# Altium integrated library Integrated_Library - 02.02.25 - 22.49.IntLib: 792 symbols (part 6 of 11)
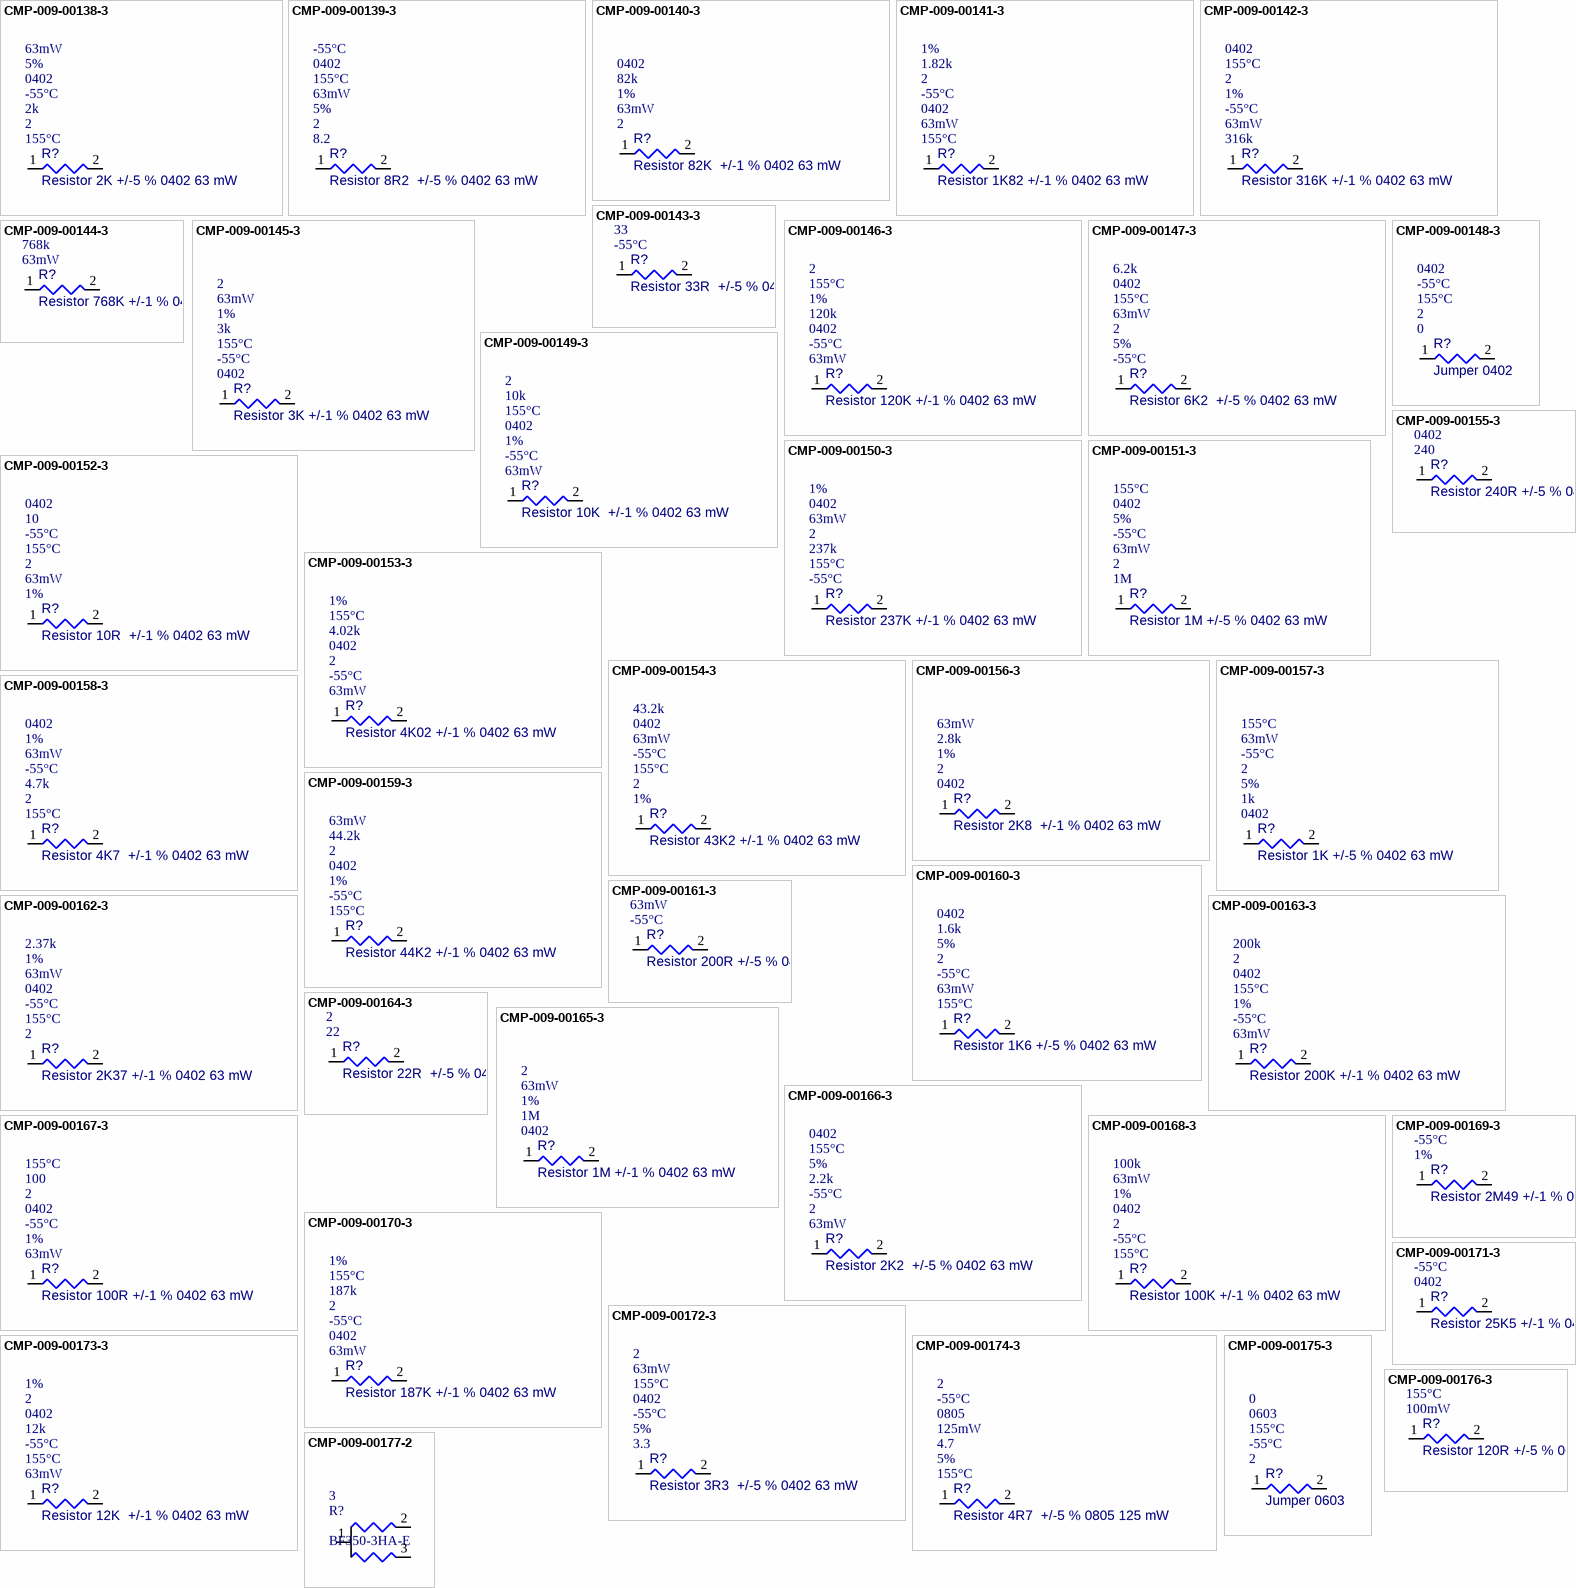
[diagram p31: symbols CMP-009-00138-3 to CMP-009-00177-2]

## CMP-009-00150-3
designator R?, comment Resistor 237K +/-1 % 0402 63 mW  value 237k  Min Operating Temperature: -55°C  Max Operating Temperature: 155°C  Pins: 2  Power: 63mW  Case/Package: 0402  Tolerance: 1%
Chip Resistor, 237 kOhms, +/-1 %, 63 mW, -55 to 155 degC, 0402
footprint RESC0805(2012)_L (Chip Resistor, Body 2.0x1.3mm, IPC High Density)
footprint RESC0402(1005)_L-1 (Chip Resistor, Body 1.0x0.5mm, IPC High Density)
pins: 1, 2
1 alternate drawing of the same symbol

## CMP-009-00151-3
designator R?, comment Resistor 1M +/-5 % 0402 63 mW  value 1M  Pins: 2  Power: 63mW  Min Operating Temperature: -55°C  Tolerance: 5%  Case/Package: 0402  Max Operating Temperature: 155°C
Chip Resistor, 1 MOhms, +/-5 %, 63 mW, -55 to 155 degC, 0402
footprint RESC0805(2012)_L (Chip Resistor, Body 2.0x1.3mm, IPC High Density)
footprint RESC0402(1005)_L-1 (Chip Resistor, Body 1.0x0.5mm, IPC High Density)
pins: 1, 2
1 alternate drawing of the same symbol

## CMP-009-00152-3
designator R?, comment Resistor 10R  +/-1 % 0402 63 mW  value 10  Tolerance: 1%  Power: 63mW  Pins: 2  Max Operating Temperature: 155°C  Min Operating Temperature: -55°C  Case/Package: 0402
Chip Resistor, 10 Ohms, +/-1 %, 63 mW, -55 to 155 degC, 0402
footprint RESC0805(2012)_L (Chip Resistor, Body 2.0x1.3mm, IPC High Density)
footprint RESC0402(1005)_L-1 (Chip Resistor, Body 1.0x0.5mm, IPC High Density)
pins: 1, 2
1 alternate drawing of the same symbol

## CMP-009-00153-3
designator R?, comment Resistor 4K02 +/-1 % 0402 63 mW  value 4.02k  Power: 63mW  Min Operating Temperature: -55°C  Pins: 2  Case/Package: 0402  Max Operating Temperature: 155°C  Tolerance: 1%
Chip Resistor, 4,02 kOhms, +/-1 %, 63 mW, -55 to 155 degC, 0402
footprint RESC0805(2012)_L (Chip Resistor, Body 2.0x1.3mm, IPC High Density)
footprint RESC0402(1005)_L-1 (Chip Resistor, Body 1.0x0.5mm, IPC High Density)
pins: 1, 2
1 alternate drawing of the same symbol

## CMP-009-00154-3
designator R?, comment Resistor 43K2 +/-1 % 0402 63 mW  value 43.2k  Tolerance: 1%  Pins: 2  Max Operating Temperature: 155°C  Min Operating Temperature: -55°C  Power: 63mW  Case/Package: 0402
Chip Resistor, 43,2 kOhms, +/-1 %, 63 mW, -55 to 155 degC, 0402
footprint RESC0805(2012)_L (Chip Resistor, Body 2.0x1.3mm, IPC High Density)
footprint RESC0402(1005)_L-1 (Chip Resistor, Body 1.0x0.5mm, IPC High Density)
pins: 1, 2
1 alternate drawing of the same symbol

## CMP-009-00155-3
designator R?, comment Resistor 240R +/-5 % 0402 63 mW  value 240  Case/Package: 0402  Pins: 2  Max Operating Temperature: 155°C  Min Operating Temperature: -55°C  Power: 63mW  Tolerance: 5%
Chip Resistor, 240 Ohms, +/-5 %, 63 mW, -55 to 155 degC, 0402
footprint RESC0805(2012)_L (Chip Resistor, Body 2.0x1.3mm, IPC High Density)
footprint RESC0402(1005)_L-1 (Chip Resistor, Body 1.0x0.5mm, IPC High Density)
pins: 1, 2
1 alternate drawing of the same symbol

## CMP-009-00156-3
designator R?, comment Resistor 2K8  +/-1 % 0402 63 mW  value 2.8k  Case/Package: 0402  Pins: 2  Tolerance: 1%  Power: 63mW
Chip Resistor, 2,8 kOhms, +/-1 %, 63 mW, -55 to 155 degC, 0402
footprint RESC0805(2012)_L (Chip Resistor, Body 2.0x1.3mm, IPC High Density)
footprint RESC0402(1005)_L-1 (Chip Resistor, Body 1.0x0.5mm, IPC High Density)
pins: 1, 2
1 alternate drawing of the same symbol

## CMP-009-00157-3
designator R?, comment Resistor 1K +/-5 % 0402 63 mW  value 1k  Case/Package: 0402  Tolerance: 5%  Pins: 2  Min Operating Temperature: -55°C  Power: 63mW  Max Operating Temperature: 155°C
Chip Resistor, 1 kOhms, +/-5 %, 63 mW, -55 to 155 degC, 0402
footprint RESC0805(2012)_L (Chip Resistor, Body 2.0x1.3mm, IPC High Density)
footprint RESC0402(1005)_L-1 (Chip Resistor, Body 1.0x0.5mm, IPC High Density)
pins: 1, 2
1 alternate drawing of the same symbol

## CMP-009-00158-3
designator R?, comment Resistor 4K7  +/-1 % 0402 63 mW  value 4.7k  Max Operating Temperature: 155°C  Pins: 2  Min Operating Temperature: -55°C  Power: 63mW  Tolerance: 1%  Case/Package: 0402
Chip Resistor, 4,7 kOhms, +/-1 %, 63 mW, -55 to 155 degC, 0402
footprint RESC0805(2012)_L (Chip Resistor, Body 2.0x1.3mm, IPC High Density)
footprint RESC0402(1005)_L-1 (Chip Resistor, Body 1.0x0.5mm, IPC High Density)
pins: 1, 2
1 alternate drawing of the same symbol

## CMP-009-00159-3
designator R?, comment Resistor 44K2 +/-1 % 0402 63 mW  value 44.2k  Max Operating Temperature: 155°C  Min Operating Temperature: -55°C  Tolerance: 1%  Case/Package: 0402  Pins: 2  Power: 63mW
Chip Resistor, 44,2 kOhms, +/-1 %, 63 mW, -55 to 155 degC, 0402
footprint RESC0805(2012)_L (Chip Resistor, Body 2.0x1.3mm, IPC High Density)
footprint RESC0402(1005)_L-1 (Chip Resistor, Body 1.0x0.5mm, IPC High Density)
pins: 1, 2
1 alternate drawing of the same symbol

## CMP-009-00160-3
designator R?, comment Resistor 1K6 +/-5 % 0402 63 mW  value 1.6k  Max Operating Temperature: 155°C  Power: 63mW  Min Operating Temperature: -55°C  Pins: 2  Tolerance: 5%  Case/Package: 0402
Chip Resistor, 1,6 kOhms, +/-5 %, 63 mW, -55 to 155 degC, 0402
footprint RESC0805(2012)_L (Chip Resistor, Body 2.0x1.3mm, IPC High Density)
footprint RESC0402(1005)_L-1 (Chip Resistor, Body 1.0x0.5mm, IPC High Density)
pins: 1, 2
1 alternate drawing of the same symbol

## CMP-009-00161-3
designator R?, comment Resistor 200R +/-5 % 0402 63 mW  value 200  Min Operating Temperature: -55°C  Power: 63mW  Tolerance: 5%  Case/Package: 0402  Max Operating Temperature: 155°C  Pins: 2
Chip Resistor, 200 Ohms, +/-5 %, 63 mW, -55 to 155 degC, 0402
footprint RESC0805(2012)_L (Chip Resistor, Body 2.0x1.3mm, IPC High Density)
footprint RESC0402(1005)_L-1 (Chip Resistor, Body 1.0x0.5mm, IPC High Density)
pins: 1, 2
1 alternate drawing of the same symbol

## CMP-009-00162-3
designator R?, comment Resistor 2K37 +/-1 % 0402 63 mW  value 2.37k  Pins: 2  Max Operating Temperature: 155°C  Min Operating Temperature: -55°C  Case/Package: 0402  Power: 63mW  Tolerance: 1%
Chip Resistor, 2,37 kOhms, +/-1 %, 63 mW, -55 to 155 degC, 0402
footprint RESC0805(2012)_L (Chip Resistor, Body 2.0x1.3mm, IPC High Density)
footprint RESC0402(1005)_L-1 (Chip Resistor, Body 1.0x0.5mm, IPC High Density)
pins: 1, 2
1 alternate drawing of the same symbol

## CMP-009-00163-3
designator R?, comment Resistor 200K +/-1 % 0402 63 mW  value 200k  Power: 63mW  Min Operating Temperature: -55°C  Tolerance: 1%  Max Operating Temperature: 155°C  Case/Package: 0402  Pins: 2
Chip Resistor, 200 kOhms, +/-1 %, 63 mW, -55 to 155 degC, 0402
footprint RESC0805(2012)_L (Chip Resistor, Body 2.0x1.3mm, IPC High Density)
footprint RESC0402(1005)_L-1 (Chip Resistor, Body 1.0x0.5mm, IPC High Density)
pins: 1, 2
1 alternate drawing of the same symbol

## CMP-009-00164-3
designator R?, comment Resistor 22R  +/-5 % 0402 63 mW  value 22  Pins: 2  Min Operating Temperature: -55°C  Max Operating Temperature: 155°C  Case/Package: 0402  Tolerance: 5%  Power: 63mW
Chip Resistor, 22 Ohms, +/-5 %, 63 mW, -55 to 155 degC, 0402
footprint RESC0805(2012)_L (Chip Resistor, Body 2.0x1.3mm, IPC High Density)
footprint RESC0402(1005)_L-1 (Chip Resistor, Body 1.0x0.5mm, IPC High Density)
pins: 1, 2
1 alternate drawing of the same symbol

## CMP-009-00165-3
designator R?, comment Resistor 1M +/-1 % 0402 63 mW  value 1M  Case/Package: 0402  Tolerance: 1%  Power: 63mW  Pins: 2
Chip Resistor, 1 MOhms, +/-1 %, 63 mW, -55 to 155 degC, 0402
footprint RESC0805(2012)_L (Chip Resistor, Body 2.0x1.3mm, IPC High Density)
footprint RESC0402(1005)_L-1 (Chip Resistor, Body 1.0x0.5mm, IPC High Density)
pins: 1, 2
1 alternate drawing of the same symbol

## CMP-009-00166-3
designator R?, comment Resistor 2K2  +/-5 % 0402 63 mW  value 2.2k  Power: 63mW  Pins: 2  Min Operating Temperature: -55°C  Tolerance: 5%  Max Operating Temperature: 155°C  Case/Package: 0402
Chip Resistor, 2,2 kOhms, +/-5 %, 63 mW, -55 to 155 degC, 0402
footprint RESC0805(2012)_L (Chip Resistor, Body 2.0x1.3mm, IPC High Density)
footprint RESC0402(1005)_L-1 (Chip Resistor, Body 1.0x0.5mm, IPC High Density)
pins: 1, 2
1 alternate drawing of the same symbol

## CMP-009-00167-3
designator R?, comment Resistor 100R +/-1 % 0402 63 mW  value 100  Power: 63mW  Tolerance: 1%  Min Operating Temperature: -55°C  Case/Package: 0402  Pins: 2  Max Operating Temperature: 155°C
Chip Resistor, 100 Ohms, +/-1 %, 63 mW, -55 to 155 degC, 0402
footprint RESC0805(2012)_L (Chip Resistor, Body 2.0x1.3mm, IPC High Density)
footprint RESC0402(1005)_L-1 (Chip Resistor, Body 1.0x0.5mm, IPC High Density)
pins: 1, 2
1 alternate drawing of the same symbol

## CMP-009-00168-3
designator R?, comment Resistor 100K +/-1 % 0402 63 mW  value 100k  Max Operating Temperature: 155°C  Min Operating Temperature: -55°C  Pins: 2  Case/Package: 0402  Tolerance: 1%  Power: 63mW
Chip Resistor, 100 kOhms, +/-1 %, 63 mW, -55 to 155 degC, 0402
footprint RESC0805(2012)_L (Chip Resistor, Body 2.0x1.3mm, IPC High Density)
footprint RESC0402(1005)_L-1 (Chip Resistor, Body 1.0x0.5mm, IPC High Density)
pins: 1, 2
1 alternate drawing of the same symbol

## CMP-009-00169-3
designator R?, comment Resistor 2M49 +/-1 % 0402 63 mW  value 2.49M  Tolerance: 1%  Min Operating Temperature: -55°C  Max Operating Temperature: 155°C  Pins: 2  Power: 63mW  Case/Package: 0402
Chip Resistor, 2,49 MOhms, +/-1 %, 63 mW, -55 to 155 degC, 0402
footprint RESC0805(2012)_L (Chip Resistor, Body 2.0x1.3mm, IPC High Density)
footprint RESC0402(1005)_L-1 (Chip Resistor, Body 1.0x0.5mm, IPC High Density)
pins: 1, 2
1 alternate drawing of the same symbol

## CMP-009-00170-3
designator R?, comment Resistor 187K +/-1 % 0402 63 mW  value 187k  Power: 63mW  Case/Package: 0402  Min Operating Temperature: -55°C  Pins: 2  Max Operating Temperature: 155°C  Tolerance: 1%
Chip Resistor, 187 kOhms, +/-1 %, 63 mW, -55 to 155 degC, 0402
footprint RESC0805(2012)_L (Chip Resistor, Body 2.0x1.3mm, IPC High Density)
footprint RESC0402(1005)_L-1 (Chip Resistor, Body 1.0x0.5mm, IPC High Density)
pins: 1, 2
1 alternate drawing of the same symbol

## CMP-009-00171-3
designator R?, comment Resistor 25K5 +/-1 % 0402 63 mW  value 25.5k  Case/Package: 0402  Min Operating Temperature: -55°C  Max Operating Temperature: 155°C  Tolerance: 1%  Pins: 2  Power: 63mW
Chip Resistor, 25,5 kOhms, +/-1 %, 63 mW, -55 to 155 degC, 0402
footprint RESC0805(2012)_L (Chip Resistor, Body 2.0x1.3mm, IPC High Density)
footprint RESC0402(1005)_L-1 (Chip Resistor, Body 1.0x0.5mm, IPC High Density)
pins: 1, 2
1 alternate drawing of the same symbol

## CMP-009-00172-3
designator R?, comment Resistor 3R3  +/-5 % 0402 63 mW  value 3.3  Tolerance: 5%  Min Operating Temperature: -55°C  Case/Package: 0402  Max Operating Temperature: 155°C  Power: 63mW  Pins: 2
Chip Resistor, 3,3 Ohms, +/-5 %, 63 mW, -55 to 155 degC, 0402
footprint RESC0805(2012)_L (Chip Resistor, Body 2.0x1.3mm, IPC High Density)
footprint RESC0402(1005)_L-1 (Chip Resistor, Body 1.0x0.5mm, IPC High Density)
pins: 1, 2
1 alternate drawing of the same symbol

## CMP-009-00173-3
designator R?, comment Resistor 12K  +/-1 % 0402 63 mW  value 12k  Power: 63mW  Max Operating Temperature: 155°C  Min Operating Temperature: -55°C  Case/Package: 0402  Pins: 2  Tolerance: 1%
Chip Resistor, 12 kOhms, +/-1 %, 63 mW, -55 to 155 degC, 0402
footprint RESC0805(2012)_L (Chip Resistor, Body 2.0x1.3mm, IPC High Density)
footprint RESC0402(1005)_L-1 (Chip Resistor, Body 1.0x0.5mm, IPC High Density)
pins: 1, 2
1 alternate drawing of the same symbol

## CMP-009-00174-3
designator R?, comment Resistor 4R7  +/-5 % 0805 125 mW  value 4.7  Max Operating Temperature: 155°C  Tolerance: 5%  Power: 125mW  Case/Package: 0805  Min Operating Temperature: -55°C  Pins: 2
Chip Resistor, 4,7 Ohms, +/-5 %, 125 mW, -55 to 155 degC, 0805
footprint RESC0805(2012)_L (Chip Resistor, Body 2.0x1.3mm, IPC High Density)
footprint RESC0805(2012)_L-13 (Chip Resistor, Body 2.0x1.3mm, IPC High Density)
pins: 1, 2
1 alternate drawing of the same symbol

## CMP-009-00175-3
designator R?, comment Jumper 0603  value 0  Pins: 2  Min Operating Temperature: -55°C  Max Operating Temperature: 155°C  Case/Package: 0603
footprint RESC0805(2012)_L (Chip Resistor, Body 2.0x1.3mm, IPC High Density)
footprint RESC0603(1608)_L-21 (Chip Resistor, Body 1.6x0.8mm, IPC High Density)
pins: 1, 2
1 alternate drawing of the same symbol

## CMP-009-00176-3
designator R?, comment Resistor 120R +/-5 % 0603 0.1 W  value 120  Power: 100mW  Max Operating Temperature: 155°C  Pins: 2  Tolerance: 5%  Case/Package: 0603  Min Operating Temperature: -55°C
Chip Resistor, 120 Ohms, +/-5 %, 0.1 W, -55 to 155 degC, 0603
footprint RESC0805(2012)_L (Chip Resistor, Body 2.0x1.3mm, IPC High Density)
footprint RESC0603(1608)_L-21 (Chip Resistor, Body 1.6x0.8mm, IPC High Density)
pins: 1, 2
1 alternate drawing of the same symbol

## CMP-009-00177-2
designator R?, comment BF350-3HA-E  Pins: 3
STRAIN GAUGE, SHEAR, 350OHM +/- 3OHM; Design Item ID: BF350-3HA-E; Source: Power_Meter.SchLib
footprint BF350-3HA-E-Footprint-1
pins: 1, 2, 3

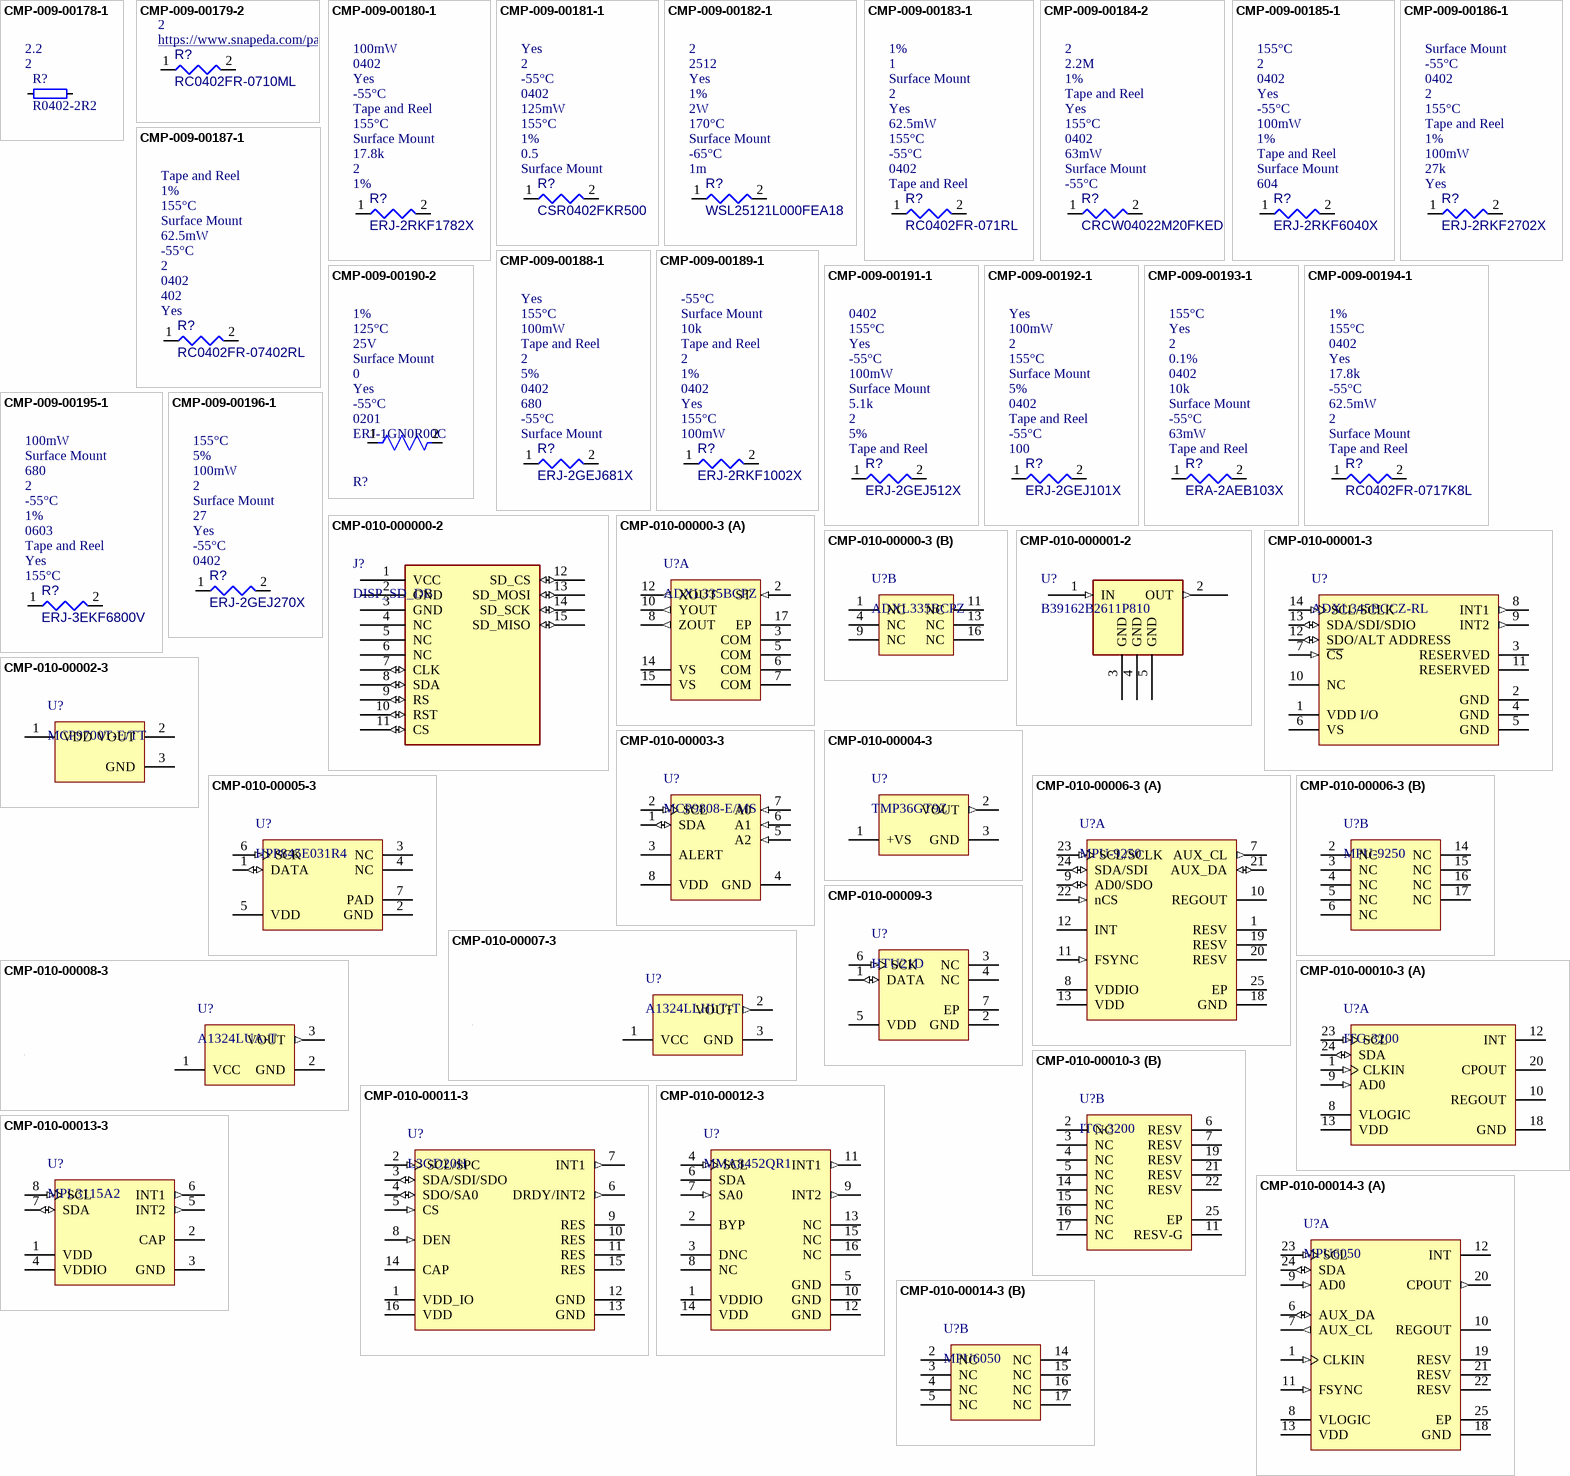
[diagram p14: symbols CMP-009-00178-1 to CMP-010-00014-3]

## CMP-009-00178-1
designator R?, comment R0402-2R2  value 2.2  Pins: 2
Resistor, ±1%, 0.063W; Published: 2012-06-22; Part Number: R0402-2R2; Design Item ID: R0402-2R2; LatestRevisionDate: 2012-06-22; Component Type: Standard; Footprint Doc: 0402; Pad Count: 2; Source: nrf52840_qiaa.SCHLIB
footprint RESC1005X04L
footprint RESC1005X04L
pins: 1, 2

## CMP-009-00179-2
designator R?, comment RC0402FR-0710ML  value 10M  Pins: 2  Case/Package: 1005 Panasonic Electronic Components
10 MOhms Â±1% 0.063W, 1/16W Chip Resistor 0402 (1005 Metric) Moisture Resistant Thick Film; MF: Yageo; Check_prices: https://www.snapeda.com/parts/RC0402FR-0710ML/Yageo/view-part/106124/?ref=eda; Price: None; Mouser-Purchase-URL: https://snapeda.com/shop?store=Mouser&id=106124; Arrow_Electronics-Purchase-URL: https://snapeda.com/shop?store=Arrow+Electronics&id=106124; Source: RC0402FR-0710ML.SchLib; SnapEDA_Link: https://www.snapeda.com/parts/RC0402FR-0710ML/Yageo/view-part/106124/?ref=snap; Component Type: Standard; DigiKey-Purchase-URL: https://snapeda.com/shop?store=DigiKey&id=106124; MP: RC0402FR-0710ML; Design Item ID: RC0402FR-0710ML; Availability: Good
footprint RESC0805(2012)_L (Chip Resistor, Body 2.0x1.3mm, IPC High Density)
footprint RESC1005X40N
pins: 1, 2
1 alternate drawing of the same symbol

## CMP-009-00180-1
designator R?, comment ERJ-2RKF1782X  value 17.8k  Tolerance: 1%  Pins: 2  Mounting Technology: Surface Mount  Max Operating Temperature: 155°C  Packaging: Tape and Reel  Min Operating Temperature: -55°C  RoHS Compliant: Yes  Case/Package: 0402  Power: 100mW
Fixed Resistor, Metal Glaze/thick Film, 0.1W, 17800ohm, 50V, 1% +/-Tol, 100ppm/Cel, Surface Mount, 0402; Package Length: 1mm; Rated Temperature: 70°C; Package Height: 0.35mm; Package Width: 0.5mm; Reference Standard: AEC-Q200; Temperature Coefficient (ppm/Cel): 100; Terminal Finish: Nickel; Working Voltage: 50V; Termination: Wraparound; Package Shape: Rectangular; Technology: METAL GLAZE/THICK FILM; Reach SVHC Compliant: Yes; JESD-609 Code: e3; Resistor Type: FIXED RESISTOR; Construction: Rectangular
footprint RESC0805(2012)_L (Chip Resistor, Body 2.0x1.3mm, IPC High Density)
footprint RESC1005X40X25NL05T05-36 (Chip Resistor, 2-Leads, Body 1.00x0.50mm, IPC Medium Density)
footprint RESC1005X40X25ML05T05-35 (Chip Resistor, 2-Leads, Body 1.00x0.50mm, IPC Low Density)
footprint RESC1005X40X25LL05T05-34 (Chip Resistor, 2-Leads, Body 1.00x0.50mm, IPC High Density)
pins: 1, 2
1 alternate drawing of the same symbol

## CMP-009-00181-1
designator R?, comment CSR0402FKR500  value 0.5  Mounting Technology: Surface Mount  Tolerance: 1%  Max Operating Temperature: 155°C  Power: 125mW  Case/Package: 0402  Min Operating Temperature: -55°C  Pins: 2  RoHS Compliant: Yes
Fixed Resistor, Metal Glaze/thick Film, 0.125W, 0.5ohm, 1% +/-Tol, 200ppm/Cel, Surface Mount, 0402
footprint RESC0805(2012)_L (Chip Resistor, Body 2.0x1.3mm, IPC High Density)
footprint FP-CSR0402-IPC_A
footprint FP-CSR0402-IPC_C
footprint FP-CSR0402-MFG
footprint FP-CSR0402-IPC_B
pins: 1, 2
1 alternate drawing of the same symbol

## CMP-009-00182-1
designator R?, comment WSL25121L000FEA18  value 1m  Min Operating Temperature: -65°C  Mounting Technology: Surface Mount  Max Operating Temperature: 170°C  Power: 2W  Tolerance: 1%  RoHS Compliant: Yes  Case/Package: 2512  Pins: 2
Fixed Resistor, Metal Strip, 2W, 0.001ohm, 0.045V, 1% +/-Tol, 275ppm/Cel, Surface Mount, 2512
footprint RESC0805(2012)_L (Chip Resistor, Body 2.0x1.3mm, IPC High Density)
footprint FP-WSL2512-IPC_A
footprint FP-WSL2512-IPC_C
footprint FP-WSL2512-MFG
footprint FP-WSL2512-IPC_B
pins: 1, 2
1 alternate drawing of the same symbol

## CMP-009-00183-1
designator R?, comment RC0402FR-071RL  value 1  Packaging: Tape and Reel  Case/Package: 0402  Min Operating Temperature: -55°C  Max Operating Temperature: 155°C  Power: 62.5mW  RoHS Compliant: Yes  Pins: 2  Mounting Technology: Surface Mount  Tolerance: 1%
Fixed Resistor, Metal Glaze/thick Film, 0.0625W, 1ohm, 50V, 1% +/-Tol, 200ppm/Cel, Surface Mount, 0402; Rated Temperature: 70°C; Package Width: 0.5mm; Package Height: 0.35mm; Additional Feature: LASER TRIMMABLE; Temperature Coefficient (ppm/Cel): 200; Package Length: 1mm; Working Voltage: 50V; Resistor Type: FIXED RESISTOR; Reach SVHC Compliant: Yes; Package Shape: Rectangular; JESD-609 Code: e3; Terminal Finish: Nickel; Construction: Chip; Termination: Wraparound; Technology: METAL GLAZE/THICK FILM
footprint RESC0805(2012)_L (Chip Resistor, Body 2.0x1.3mm, IPC High Density)
footprint RESC1005X40X25ML05T10 (Chip Resistor, 2-Leads, Body 1.00x0.50mm, IPC Low Density)
footprint RESC1005X40X25LL05T10 (Chip Resistor, 2-Leads, Body 1.00x0.50mm, IPC High Density)
footprint RESC1005X40X25NL05T10 (Chip Resistor, 2-Leads, Body 1.00x0.50mm, IPC Medium Density)
pins: 1, 2
1 alternate drawing of the same symbol

## CMP-009-00184-2
designator R?, comment CRCW04022M20FKED  value 2.2M  Min Operating Temperature: -55°C  Mounting Technology: Surface Mount  Power: 63mW  Case/Package: 0402  Max Operating Temperature: 155°C  RoHS Compliant: Yes  Packaging: Tape and Reel  Tolerance: 1%  Pins: 2
Fixed Resistor, Metal Glaze/thick Film, 0.063W, 2200000ohm, 50V, 1% +/-Tol, 100ppm/Cel, Surface Mount, 0402; Package Width: 0.5mm; Package Length: 1mm; Reference Standard: AEC-Q200; Package Height: 0.35mm; Rated Temperature: 70°C; Temperature Coefficient (ppm/Cel): 100; Working Voltage: 50V; Package Shape: Rectangular; Construction: Chip; Terminal Finish: Nickel; Reach SVHC Compliant: Yes; Resistor Type: FIXED RESISTOR; Termination: Wraparound; JESD-609 Code: e3; Technology: METAL GLAZE/THICK FILM
footprint RESC0805(2012)_L (Chip Resistor, Body 2.0x1.3mm, IPC High Density)
footprint FP-CRCW0402-e3-IPC_A
footprint FP-CRCW0402-e3-IPC_C
footprint FP-CRCW0402-e3-MFG
footprint FP-CRCW0402-e3-IPC_B
pins: 1, 2
1 alternate drawing of the same symbol

## CMP-009-00185-1
designator R?, comment ERJ-2RKF6040X  value 604  Mounting Technology: Surface Mount  Packaging: Tape and Reel  Tolerance: 1%  Power: 100mW  Min Operating Temperature: -55°C  RoHS Compliant: Yes  Case/Package: 0402  Pins: 2  Max Operating Temperature: 155°C
Fixed Resistor, Metal Glaze/thick Film, 0.1W, 604ohm, 50V, 1% +/-Tol, 100ppm/Cel, Surface Mount, 0402; Temperature Coefficient (ppm/Cel): 100; Package Width: 0.5mm; Package Length: 1mm; Rated Temperature: 70°C; Package Height: 0.35mm; Reference Standard: AEC-Q200; Terminal Finish: Nickel; Resistor Type: FIXED RESISTOR; Technology: METAL GLAZE/THICK FILM; Package Shape: Rectangular; Working Voltage: 50V; Construction: Rectangular; Termination: Wraparound; JESD-609 Code: e3; Reach SVHC Compliant: Yes
footprint RESC0805(2012)_L (Chip Resistor, Body 2.0x1.3mm, IPC High Density)
footprint RESC1005X40X25LL05T05 (Chip Resistor, 2-Leads, Body 1.00x0.50mm, IPC High Density)
footprint RESC1005X40X25NL05T05 (Chip Resistor, 2-Leads, Body 1.00x0.50mm, IPC Medium Density)
footprint RESC1005X40X25ML05T05 (Chip Resistor, 2-Leads, Body 1.00x0.50mm, IPC Low Density)
pins: 1, 2
1 alternate drawing of the same symbol

## CMP-009-00186-1
designator R?, comment ERJ-2RKF2702X  value 27k  RoHS Compliant: Yes  Power: 100mW  Tolerance: 1%  Packaging: Tape and Reel  Max Operating Temperature: 155°C  Pins: 2  Case/Package: 0402  Min Operating Temperature: -55°C  Mounting Technology: Surface Mount
Fixed Resistor, Metal Glaze/thick Film, 0.1W, 27000ohm, 50V, 1% +/-Tol, 100ppm/Cel, Surface Mount, 0402; Package Length: 1mm; Package Height: 0.35mm; Reference Standard: AEC-Q200; Package Width: 0.5mm; Temperature Coefficient (ppm/Cel): 100; Rated Temperature: 70°C; JESD-609 Code: e3; Reach SVHC Compliant: Yes; Technology: METAL GLAZE/THICK FILM; Termination: Wraparound; Working Voltage: 50V; Resistor Type: FIXED RESISTOR; Package Shape: Rectangular; Terminal Finish: Nickel; Construction: Rectangular
footprint RESC0805(2012)_L (Chip Resistor, Body 2.0x1.3mm, IPC High Density)
footprint RESC1005X40X25NL05T05-36 (Chip Resistor, 2-Leads, Body 1.00x0.50mm, IPC Medium Density)
footprint RESC1005X40X25LL05T05-34 (Chip Resistor, 2-Leads, Body 1.00x0.50mm, IPC High Density)
footprint RESC1005X40X25ML05T05-35 (Chip Resistor, 2-Leads, Body 1.00x0.50mm, IPC Low Density)
pins: 1, 2
1 alternate drawing of the same symbol

## CMP-009-00187-1
designator R?, comment RC0402FR-07402RL  value 402  RoHS Compliant: Yes  Case/Package: 0402  Pins: 2  Min Operating Temperature: -55°C  Power: 62.5mW  Mounting Technology: Surface Mount  Max Operating Temperature: 155°C  Tolerance: 1%  Packaging: Tape and Reel
Fixed Resistor, Metal Glaze/thick Film, 0.0625W, 402ohm, 50V, 1% +/-Tol, 100ppm/Cel, Surface Mount, 0402; Package Length: 1mm; Temperature Coefficient (ppm/Cel): 100; Additional Feature: LASER TRIMMABLE; Package Height: 0.35mm; Package Width: 0.5mm; Rated Temperature: 70°C; Construction: Chip; Resistor Type: FIXED RESISTOR; JESD-609 Code: e3; Working Voltage: 50V; Termination: Wraparound; Reach SVHC Compliant: Yes; Terminal Finish: Nickel; Technology: METAL GLAZE/THICK FILM; Package Shape: Rectangular
footprint RESC0805(2012)_L (Chip Resistor, Body 2.0x1.3mm, IPC High Density)
footprint RESC1005X40X25ML05T10-15 (Chip Resistor, 2-Leads, Body 1.00x0.50mm, IPC Low Density)
footprint RESC1005X40X25NL05T10-16 (Chip Resistor, 2-Leads, Body 1.00x0.50mm, IPC Medium Density)
footprint RESC1005X40X25LL05T10-14 (Chip Resistor, 2-Leads, Body 1.00x0.50mm, IPC High Density)
pins: 1, 2
1 alternate drawing of the same symbol
